# Altium footprint library Dr.Xiong_20160818.PcbLib: 266 footprints (part 6 of 17)
Each footprint in its own frame and in the unit in brackets; x right, y up, seen from the top. Pads: shape width x height; smd on the part's side, far side on the other; paste and mask are expansions set on the pad; w line width, h text height; cw(c..) or ccw(c..) is an arc to the next point about the centre after c.
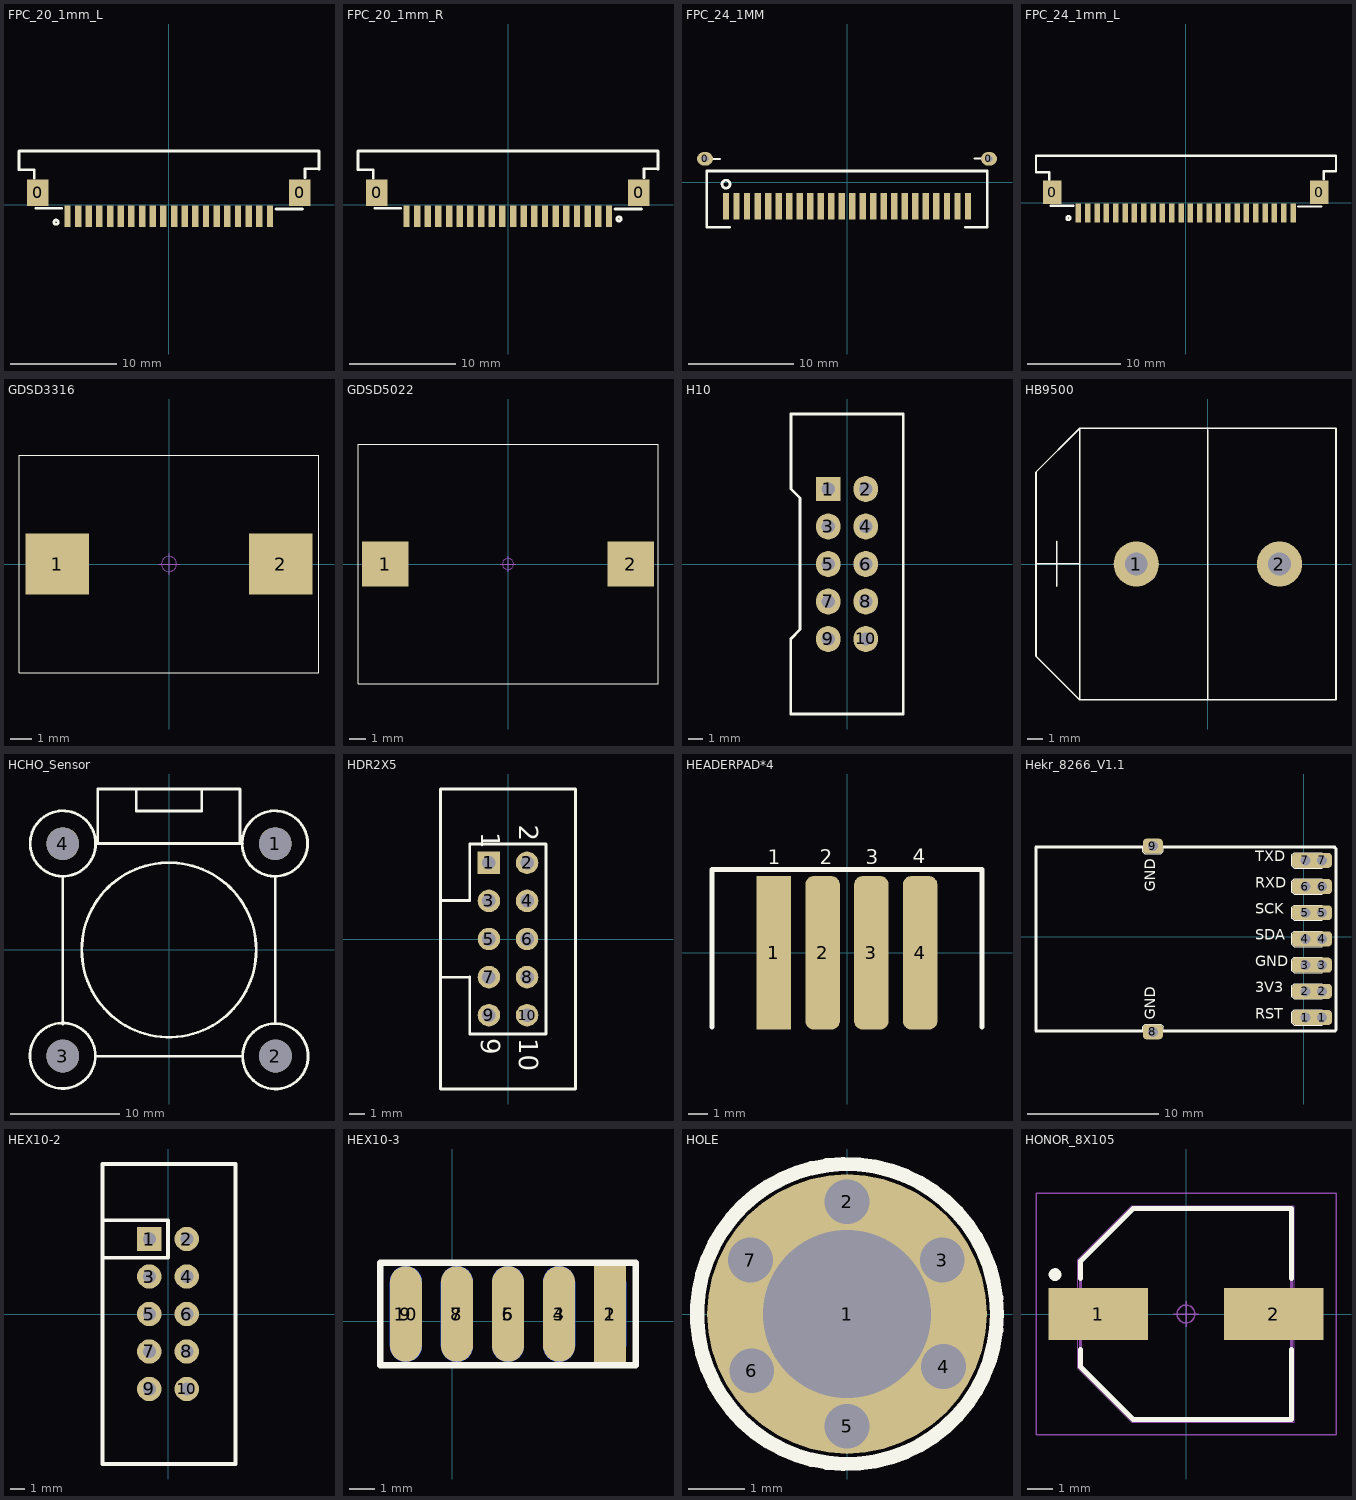
[diagram p5: the footprints below, top view; thin cyan lines are the x and y axes]

## FPC_20_1mm_L [mm]
pads (22):
  rect 2x2.5 smd: 0(-12.3,1.1) 0(12.3,1.1)
  rect 0.6x2 smd: 1(-9.5,-1.1) 2(-8.5,-1.1) 3(-7.5,-1.1) 4(-6.5,-1.1) 5(-5.5,-1.1) 6(-4.5,-1.1) 7(-3.5,-1.1) 8(-2.5,-1.1) 9(-1.5,-1.1) 10(-0.5,-1.1) 11(0.5,-1.1) 12(1.5,-1.1) 13(2.5,-1.1) 14(3.5,-1.1) 15(4.5,-1.1) 16(5.5,-1.1) 17(6.5,-1.1) 18(7.5,-1.1) 19(8.5,-1.1) 20(9.5,-1.1)
Top Overlay:
  circle w0.254: c-10.566,-1.651 r0.203
  lines w0.254: -12.624,2.464 -12.624,3.277 -14.046,3.277 -14.046,5.004 -14.021,5.029 14.097,5.029 14.097,3.327 14.072,3.353 12.776,3.353 12.776,2.515 ; -12.446,-0.33 -10.033,-0.33 ; 10.058,-0.406 12.548,-0.406

## FPC_20_1mm_R [mm]
pads (22):
  rect 2x2.5 smd: 0(-12.325,1.1) 0(12.275,1.1)
  rect 0.6x2 smd: 1(9.475,-1.1) 2(8.475,-1.1) 3(7.475,-1.1) 4(6.475,-1.1) 5(5.475,-1.1) 6(4.475,-1.1) 7(3.475,-1.1) 8(2.475,-1.1) 9(1.475,-1.1) 10(0.475,-1.1) 11(-0.525,-1.1) 12(-1.525,-1.1) 13(-2.525,-1.1) 14(-3.525,-1.1) 15(-4.525,-1.1) 16(-5.525,-1.1) 17(-6.525,-1.1) 18(-7.525,-1.1) 19(-8.525,-1.1) 20(-9.525,-1.1)
Top Overlay:
  circle w0.254: c10.414,-1.346 r0.203
  lines w0.254: -12.649,2.464 -12.649,3.277 -14.072,3.277 -14.072,5.004 -14.046,5.029 14.072,5.029 14.072,3.327 14.046,3.353 12.751,3.353 12.751,2.515 ; -12.471,-0.33 -10.058,-0.33 ; 10.033,-0.406 12.522,-0.406

## FPC_24_1MM [mm]
pads (26):
  oval 1.524x1.27 hole 0.635: 0(-13.5,2.25) 0(13.5,2.25)
  rect 0.6x2.5 smd: 1(-11.5,-2.25) 2(-10.5,-2.25) 3(-9.5,-2.25) 4(-8.5,-2.25) 5(-7.5,-2.25) 6(-6.5,-2.25) 7(-5.5,-2.25) 8(-4.5,-2.25) 9(-3.5,-2.25) 10(-2.5,-2.25) 11(-1.5,-2.25) 12(-0.5,-2.25) 13(0.5,-2.25) 14(1.5,-2.25) 15(2.5,-2.25) 16(3.5,-2.25) 17(4.5,-2.25) 18(5.5,-2.25) 19(6.5,-2.25) 20(7.5,-2.25) 21(8.5,-2.25) 22(9.5,-2.25) 23(10.5,-2.25) 24(11.5,-2.25)
Top Overlay:
  circle w0.254: c-11.5,-0.159 r0.381
  lines w0.178: -13.496,2.22 -12.058,2.22 ; 12.135,2.271 13.42,2.271
  lines w0.254: -11.169,-4.249 -13.328,-4.249 -13.328,1.085 13.328,1.085 13.328,-4.249 ; 11.246,-4.249 13.303,-4.249

## FPC_24_1mm_L [mm]
pads (26):
  rect 2x2.5 smd: 0(-14.3,1.1) 0(14.3,1.1)
  rect 0.6x2 smd: 1(-11.5,-1.1) 2(-10.5,-1.1) 3(-9.5,-1.1) 4(-8.5,-1.1) 5(-7.5,-1.1) 6(-6.5,-1.1) 7(-5.5,-1.1) 8(-4.5,-1.1) 9(-3.5,-1.1) 10(-2.5,-1.1) 11(-1.5,-1.1) 12(-0.5,-1.1) 13(0.5,-1.1) 14(1.5,-1.1) 15(2.5,-1.1) 16(3.5,-1.1) 17(4.5,-1.1) 18(5.5,-1.1) 19(6.5,-1.1) 20(7.5,-1.1) 21(8.5,-1.1) 22(9.5,-1.1) 23(10.5,-1.1) 24(11.5,-1.1)
Top Overlay:
  circle w0.254: c-12.566,-1.651 r0.203
  lines w0.254: -14.624,2.464 -14.624,3.277 -16.046,3.277 -16.046,5.004 -16.021,5.029 16.097,5.029 16.097,3.37 ; -14.446,-0.33 -12.033,-0.33 ; 12.058,-0.406 14.548,-0.406 ; 14.776,2.515 14.776,3.353 16.072,3.353 16.046,3.378

## GDSD3316 [mm]
pads (2):
  rect 2.92x2.79 smd: 1(-5.145,0) 2(5.145,0)
Top Overlay:
  lines w0.05: -6.9,-5 6.9,-5 6.9,5 -6.9,5 -6.9,-5
Mechanical 16:
  circle w0.05: c0,0 r0.35
  lines w0.05: -0.5,0 0.5,0 ; 0,-0.5 0,0.5

## GDSD5022 [mm]
pads (2):
  rect 2.92x2.79 smd: 1(-7.685,0) 2(7.685,0)
Top Overlay:
  lines w0.05: -9.4,-7.5 9.4,-7.5 9.4,7.5 -9.4,7.5 -9.4,-7.5
Mechanical 16:
  circle w0.05: c0,0 r0.35
  lines w0.05: -0.5,0 0.5,0 ; 0,-0.5 0,0.5

## H10 [mil]
pads (10):
  rect 65x65 hole 35: 1(-50,200)
  oval 65x70 hole 35: 2(50,200) 3(-50,100) 4(50,100) 5(-50,0) 6(50,0) 7(-50,-100) 8(50,-100) 9(-50,-200) 10(50,-200)
Top Overlay:
  lines w7.87: -150,-400 -150,-200 -125,-175 -125,156 -125,168 -125,176 -149,200 -149,399 -150,400 150,400 150,-400 -150,-400

## HB9500 [mm]
pads (2):
  round 3 hole 1.5: 1(-4.75,0) 2(4.75,0)
Top Overlay:
  lines w0.102: -11.405,-6.036 -11.405,6.096 -8.501,9 ; -11.405,-5.969 -11.405,-6.121 -8.534,-8.992 ; -11.405,0.025 -8.585,0.025 ; -10.033,-1.473 -10.033,1.524 ; 0,-9 0,0 0,8.915 ; -8.5,9 8.5,9 8.5,-9 -8.5,-9 -8.5,9 ; -8.501,9 -8.5,9

## HCHO_Sensor [mm]
pads (4):
  round 3 hole 3: 1(9.728,9.728) 2(9.754,-9.728) 3(-9.728,-9.728) 4(-9.728,9.728)
Top Overlay:
  circle w0.254: c0,0 r8
  circle w0.254: c9.703,9.75 r3
  circle w0.254: c9.75,-9.75 r3
  circle w0.254: c-9.75,-9.703 r3
  circle w0.254: c-9.728,9.75 r3
  lines w0.254: -9.75,-6.811 -9.75,6.633 -9.728,6.731 ; -6.735,-9.75 6.735,-9.75 ; -6.728,9.75 6.735,9.75 ; -6.528,9.75 -6.528,14.75 ; -6.51,14.75 6.502,14.75 6.502,9.75 ; -3,14.75 -3,12.725 2.997,12.725 ; 3,12.75 3,14.75 ; 9.75,-6.735 9.75,6.735

## HDR2X5 [mm]
pads (10):
  rect 1.5x1.5 hole 0.9: 1(-1.27,5.08)
  round 1.5 hole 0.9: 2(1.27,5.08) 3(-1.27,2.54) 4(1.27,2.54) 5(-1.27,0) 6(1.27,0) 7(-1.27,-2.54) 8(1.27,-2.54) 9(-1.27,-5.08) 10(1.27,-5.08)
Top Overlay:
  lines w0.178: -4.5,2.565 -2.565,2.565 -2.54,2.54 -2.54,6.35 ; -4.5,9.978 -4.5,-10 4.5,-10 4.5,10 -4.5,10 ; -4.47,-2.54 -2.565,-2.54 -2.54,-2.515 -2.54,-6.35
  lines w0.2: -2.54,-6.35 2.54,-6.35 2.54,6.35 -2.54,6.35
  text "10" at 0.762,-6.604 h1.27
  text "9" at -1.778,-6.604 h1.27
  text "1" at -1.778,7.112 h1.27
  text "2" at 0.762,7.62 h1.27

## HEADERPAD*4 [mm]
pads (4):
  rect 1.8x8 smd: 1(-3.81,0)
  rrect50% 1.8x8 smd: 2(-1.27,0) 3(1.27,0) 4(3.81,0)
Top Overlay:
  lines w0.254: -7.036,-3.861 -7.036,4.343 -5.131,4.343 ; -5.156,4.343 4.953,4.343 ; 4.851,4.343 5.08,4.343 7.036,4.343 7.036,-3.861
  text "4" at 3.429,4.674 h0.76
  text "3" at 0.965,4.623 h0.76
  text "2" at -1.422,4.623 h0.76
  text "1" at -4.115,4.597 h0.76

## Hekr_8266_V1.1 [mil]
pads (16):
  rrect50% 80x45 hole 30: 1(5,-242.22) 2(5,-163.48) 3(5,-84.74) 4(5,-6) 5(5,72.74) 6(5,151.48) 7(5,230.22)
  rrect50% 60x45 hole 30: 1(55,-242.22) 2(55,-163.48) 3(55,-84.74) 4(55,-6) 5(55,72.74) 6(55,151.48) 7(55,230.22) 8(-453.42,-285.43) 9(-453.42,273.06)
Bottom Layer:
  lines w6: 20.07,247.76 31.5,236.32
Top Overlay:
  circle w1: c5,-242.22 r14.65
  circle w1: c5,-163.48 r14.65
  circle w1: c5,-84.74 r14.65
  circle w1: c5,-6 r14.65
  circle w1: c5,72.74 r14.65
  circle w1: c5,151.48 r14.65
  circle w1: c5,230.22 r14.65
  lines w1: -484.15,-282.95 -484.15,-269.58 -478.03,-263.45 -476.98,-262.4 -429.61,-262.4 -422.82,-269.19 -422.82,-282.95 ; -484.02,270.59 -484.02,256.82 -477.24,250.04 -429.87,250.04 -428.82,251.09 -422.7,257.21 -422.7,270.59 ; -483.83,270.59 -467.86,270.59 ccw(c-453.42,273.06) -438.98,270.6 -422.84,270.6 -422.82,270.59 ; -423.02,-282.95 -438.99,-282.95 ccw(c-453.42,-285.43) -467.87,-282.97 -484.01,-282.97 ; 56.17,-265.25 -28.79,-265.25 -34.87,-259.18 -35.36,-258.69 -35.36,-225.65 -28.83,-219.12 56.17,-219.12 ; 56.17,-265.2 56.17,-256.82 ; 56.15,-256.83 cw(c55,-242.22) 56.2,-227.62 56.2,-219.43 56.17,-219.4 ; 56.17,-186.51 -28.79,-186.51 -34.87,-180.43 -35.36,-179.95 -35.36,-146.91 -28.83,-140.38 56.17,-140.38 ; 56.17,-186.46 56.17,-178.08 ; 56.17,-140.66 56.2,-140.68 56.2,-148.88 ccw(c55,-163.48) 56.15,-178.09 ; 56.17,-107.77 -28.79,-107.77 -34.87,-101.69 -35.36,-101.21 -35.36,-68.17 -28.83,-61.64 56.17,-61.64 ; 56.17,-107.72 56.17,-99.34 ; 56.17,-61.92 56.2,-61.94 56.2,-70.14 ccw(c55,-84.74) 56.15,-99.35 ; 56.17,-29.03 -28.79,-29.03 -34.87,-22.95 -35.36,-22.47 -35.36,10.57 -28.83,17.1 56.17,17.1 ; 56.17,-28.98 56.17,-20.6 ; 56.17,16.82 56.2,16.8 56.2,8.6 ccw(c55,-6) 56.15,-20.61 ; 56.17,49.71 -28.79,49.71 -34.87,55.79 -35.36,56.27 -35.36,89.31 -28.83,95.84 56.17,95.84 ; 56.17,49.76 56.17,58.14 ; 56.17,95.56 56.2,95.54 56.2,87.34 ccw(c55,72.74) 56.15,58.13 ; 56.17,128.45 -28.79,128.45 -34.87,134.53 -35.36,135.01 -35.36,168.05 -28.83,174.58 56.17,174.58 ; 56.17,128.5 56.17,136.88 ; 56.15,136.87 cw(c55,151.48) 56.2,166.08 56.2,174.28 56.17,174.3 ; 56.17,207.19 -28.79,207.19 -34.87,213.27 -35.36,213.75 -35.36,246.79 -28.83,253.32 56.17,253.32 ; 56.17,207.24 56.17,215.62 ; 56.17,253.04 56.2,253.02 56.2,244.82 ccw(c55,230.22) 56.15,215.61 ; -484.02,-282.95 -484.01,-282.97 ; 56.17,-256.82 56.17,-256.82 ; 56.17,-178.08 56.17,-178.08 ; 56.17,-99.34 56.17,-99.34 ; 56.17,-20.6 56.17,-20.6 ; 56.17,58.14 56.17,58.14 ; 56.17,136.88 56.17,136.88 ; 56.17,215.62 56.17,215.62
  lines w10: 42,270.6 91.4,270.6 97,265 ; 56.22,270.6 -804.9,270.6 ; 91.71,270.29 97,265 ; -804.91,270.59 -804.91,-282.91 -804.86,-282.95 92.95,-282.95 97,-278.91 97,265 ; -804.91,270.59 -804.9,270.6
  text "RST" at -146.31,-255.86 h55
  text "3V3" at -146.31,-176.99 h55
  text "GND" at -146.36,-98.11 h55
  text "SDA" at -146.36,-19.23 h55
  text "SCK" at -146.36,59.64 h55
  text "RXD" at -146.31,138.05 h55
  text "TXD" at -146.36,216.92 h55
  text "GND" at -435.31,-248.53 h55
  text "GND" at -435.31,136.47 h55

## HEX10-2 [mil]
pads (10):
  rect 65x65 hole 35: 1(-50,200)
  round 65 hole 35: 2(50,200) 3(-50,100) 4(50,100) 5(-50,0) 6(50,0) 7(-50,-100) 8(50,-100) 9(-50,-200) 10(50,-200)
Top Overlay:
  lines w10: -175,150 0,150 0,250 -175,250 ; -175,-400 -175,400 180,400 180,-400 -175,-400

## HEX10-3 [mm]
pads (10):
  rect 1.27x3.81 smd: 1(6.276,0.283)
  oval 1.27x3.81 smd far side: 2(6.276,0.283) 4(4.244,0.283) 6(2.212,0.283) 8(0.18,0.283) 10(-1.852,0.283)
  oval 1.27x3.81 smd: 3(4.244,0.283) 5(2.212,0.283) 7(0.18,0.283) 9(-1.852,0.283)
Top Overlay:
  lines w0.254: -2.868,-1.749 -2.868,2.315 7.292,2.315 7.292,-1.749 -2.868,-1.749

## HOLE [mm]
pads (7):
  round 5 hole 3: 1(0,0)
  round 0.8 hole 0.8: 2(0,2.007) 3(1.702,0.965) 4(1.727,-0.94) 5(0,-2.007) 6(-1.702,-1.016) 7(-1.727,0.965)
Top Overlay:
  circle w0.254: c0,0 r2.682

## HONOR_8X105 [mm]
pads (2):
  rect 3.9x2.05 smd: 1(-3.45,0) 2(3.45,0)
Top Overlay:
  circle w0.25: c-5.15,1.55 r0.125
  lines w0.2: -4.15,-1.4 -4.15,-2.075 -2.075,-4.15 4.15,-4.15 4.15,-1.4 ; -4.15,1.4 -4.15,2.075 -2.075,4.15 4.15,4.15 4.15,1.4
Mechanical 1:
  lines w0.1: -4.15,-2.075 -4.15,2.075 -2.075,4.15 4.15,4.15 4.15,-4.15 -2.075,-4.15 -4.15,-2.075
  text "C1" at -0.537,-0.45 h0.75
Mechanical 16:
  circle w0.05: c0,0 r0.35
  lines w0.001: -4.25,-2.125 -4.25,2.125 -2.125,4.25 4.25,4.25 4.25,-4.25 -2.125,-4.25 -4.25,-2.125
  lines w0.05: -0.5,0 0.5,0 ; 0,-0.5 0,0.5 ; -5.9,-4.75 -5.9,4.75 5.9,4.75 5.9,-4.75 -5.9,-4.75